# Altium footprint library ICL_connectors_v1.PcbLib: 86 footprints (part 6 of 6)
Each footprint in its own frame and in the unit in brackets; x right, y up, seen from the top. Pads: shape width x height; smd on the part's side, far side on the other; paste and mask are expansions set on the pad; w line width, h text height; cw(c..) or ccw(c..) is an arc to the next point about the centre after c.
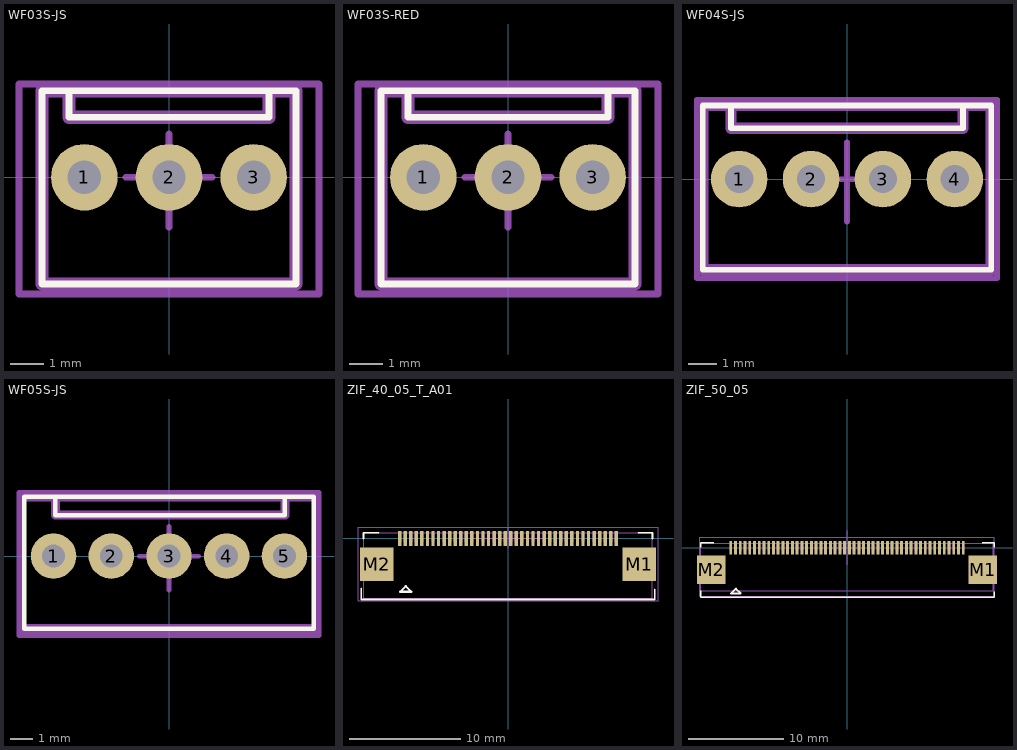
[diagram p5: the footprints below, top view; thin cyan lines are the x and y axes]

## WF03S-JS [mm] "2.54mm  3p WHITE"
pads (3):
  round 2 hole 1: 1(-2.54,0) 2(0,0) 3(2.54,0)
Top Overlay:
  lines w0.2: -3,2.6 -3,1.8 3,1.8 3,2.6 ; -3.81,-3.2 3.81,-3.2 3.81,2.6 -3.81,2.6 -3.81,-3.2
Top M15-16_SORG:
  lines w0.2: -1.3,0 0,0 ; 0,-1.5 0,0 ; 0,1.3 0,0 ; 1.3,0 0,0 ; -4.5,-3.5 -4.5,2.8 4.5,2.8 4.5,-3.5 -4.5,-3.5
Top M17-18_TDES:
  text "'.Designator'" at -5.565,-2.817 h1
Top M19-20_TMOT:
  circle w0.6: c2.54,0 r0.26
  circle w0.6: c0,0 r0.26
  circle w0.6: c-2.54,0 r0.26
  lines w0.4: -3,2.6 -3,1.8 3,1.8 3,2.6 ; -3.81,-3.2 3.81,-3.2 3.81,2.6 -3.81,2.6 -3.81,-3.2
3D body "WF03S_JS.STEP": height 11.51, standoff -3.39, extent -3.81,-3.2 3.81,2.6

## WF03S-RED [mm] "2.54mm  3p RED"
pads (3):
  round 2 hole 1: 1(-2.54,0) 2(0,0) 3(2.54,0)
Top Overlay:
  lines w0.2: -3,2.6 -3,1.8 3,1.8 3,2.6 ; -3.81,-3.2 3.81,-3.2 3.81,2.6 -3.81,2.6 -3.81,-3.2
Top M15-16_SORG:
  lines w0.2: -1.3,0 0,0 ; 0,-1.5 0,0 ; 0,1.3 0,0 ; 1.3,0 0,0 ; -4.5,-3.5 -4.5,2.8 4.5,2.8 4.5,-3.5 -4.5,-3.5
Top M17-18_TDES:
  text "'.Designator'" at -5.865,-2.517 h1
Top M19-20_TMOT:
  circle w0.6: c2.54,0 r0.26
  circle w0.6: c0,0 r0.26
  circle w0.6: c-2.54,0 r0.26
  lines w0.4: -3,2.6 -3,1.8 3,1.8 3,2.6 ; -3.81,-3.2 3.81,-3.2 3.81,2.6 -3.81,2.6 -3.81,-3.2
3D body "WF03S_RED.STEP": height 11.51, standoff -3.39, extent -3.81,-3.2 3.81,2.6

## WF04S-JS [mm] "2.54mm  4p WHITE"
pads (4):
  round 2 hole 1: 1(-3.81,0) 2(-1.27,0) 3(1.27,0) 4(3.81,0)
Top Overlay:
  lines w0.2: -4.1,2.6 -4.1,1.8 4.1,1.8 4.1,2.6 ; -5.1,-3.2 -5.1,2.6 5.1,2.6 5.1,-3.2 -5.1,-3.2
Top M15-16_SORG:
  lines w0.2: -1.3,0 0,0 ; 0,-1.5 0,0 ; 0,1.3 0,0 ; 1.3,0 0,0 ; -5.3,-3.5 5.3,-3.5 5.3,2.8 -5.3,2.8 -5.3,-3.5
Top M17-18_TDES:
  text "'.Designator'" at -5.665,-2.517 h1
Top M19-20_TMOT:
  circle w0.6: c3.81,0 r0.26
  circle w0.6: c1.27,0 r0.26
  circle w0.6: c-1.27,0 r0.26
  circle w0.6: c-3.81,0 r0.26
  lines w0.4: -4.1,2.6 -4.1,1.8 4.1,1.8 4.1,2.6 ; -5.1,-3.2 -5.1,2.6 5.1,2.6 5.1,-3.2 -5.1,-3.2
3D body "61900411121.stp": height 11.51, standoff -3.39, extent -5.08,-3.2 5.08,2.6

## WF05S-JS [mm] "2.54mm  5p WHITE"
pads (5):
  round 2 hole 1: 1(-5.08,0) 2(-2.54,0) 3(0,0) 4(2.54,0) 5(5.08,0)
Top Overlay:
  lines w0.2: -5,2.6 -5,1.8 5.1,1.8 5.1,2.6 ; -6.37,-3.2 6.37,-3.2 6.37,2.6 -6.37,2.6 -6.37,-3.2
Top M15-16_SORG:
  lines w0.2: -1.3,0 0,0 ; 0,-1.5 0,0 ; 0,1.3 0,0 ; 1.3,0 0,0 ; -6.6,-3.5 -6.6,2.8 6.6,2.8 6.6,-3.5 -6.6,-3.5
Top M17-18_TDES:
  text "'.Designator'" at -5.665,-2.517 h1
Top M19-20_TMOT:
  circle w0.6: c-2.54,0 r0.26
  circle w0.6: c0,0 r0.26
  circle w0.6: c2.54,0 r0.26
  circle w0.6: c5.08,0 r0.26
  circle w0.6: c-5.08,0 r0.26
  lines w0.4: -5,2.6 -5,1.8 5.1,1.8 5.1,2.6 ; -6.5,-3.2 -6.5,2.6 6.5,2.6 6.5,-3.2 -6.5,-3.2
3D body "STEP-61900511121-rev1.stp": height 11.51, standoff -3.39, extent -6.35,-3.2 6.35,2.6

## ZIF_40_05_T_A01 [mm] "AMPHENOL_62684-402100ALF"
pads (42):
  rect 0.3x1.35 smd: 1(-9.75,0) 2(-9.25,0) 3(-8.75,0) 4(-8.25,0) 5(-7.75,0) 6(-7.25,0) 7(-6.75,0) 8(-6.25,0) 9(-5.75,0) 10(-5.25,0) 11(-4.75,0) 12(-4.25,0) 13(-3.75,0) 14(-3.25,0) 15(-2.75,0) 16(-2.25,0) 17(-1.75,0) 18(-1.25,0) 19(-0.75,0) 20(-0.25,0) 21(0.25,0) 22(0.75,0) 23(1.25,0) 24(1.75,0) 25(2.25,0) 26(2.75,0) 27(3.25,0) 28(3.75,0) 29(4.25,0) 30(4.75,0) 31(5.25,0) 32(5.75,0) 33(6.25,0) 34(6.75,0) 35(7.25,0) 36(7.75,0) 37(8.25,0) 38(8.75,0) 39(9.25,0) 40(9.75,0)
  rect 3x3 smd: M1(11.8,-2.325) M2(-11.8,-2.325)
Top Overlay:
  lines w0.152: -13.2,-4.5 -13.2,-5.5 13.2,-5.5 13.2,-4.6 ; -13,0 -13,0.5 -11.65,0.5 ; 11.75,0.5 13,0.5 13,0
  lines w0.2: -9.2,-4.3 -8.7,-4.8 -9.7,-4.8 -9.2,-4.3 ; -9.2,-4.3 -9.2,-4.3
Top M11-12_SMOT:
  rectangle: 9.6,-0.3 9.9,0.6
  rectangle: 9.1,-0.3 9.4,0.6
  rectangle: 8.6,-0.3 8.9,0.6
  rectangle: 8.1,-0.3 8.4,0.6
  rectangle: 7.6,-0.3 7.9,0.6
  rectangle: 7.1,-0.3 7.4,0.6
  rectangle: 6.6,-0.3 6.9,0.6
  rectangle: 6.1,-0.3 6.4,0.6
  rectangle: 5.6,-0.3 5.9,0.6
  rectangle: 5.1,-0.3 5.4,0.6
  rectangle: 4.6,-0.3 4.9,0.6
  rectangle: 4.1,-0.3 4.4,0.6
  rectangle: 3.6,-0.3 3.9,0.6
  rectangle: 3.1,-0.3 3.4,0.6
  rectangle: 2.6,-0.3 2.9,0.6
  rectangle: 2.1,-0.3 2.4,0.6
  rectangle: 1.6,-0.3 1.9,0.6
  rectangle: 1.1,-0.3 1.4,0.6
  rectangle: 0.6,-0.3 0.9,0.6
  rectangle: 0.1,-0.3 0.4,0.6
  rectangle: -0.4,-0.3 -0.1,0.6
  rectangle: -0.9,-0.3 -0.6,0.6
  rectangle: -1.4,-0.3 -1.1,0.6
  rectangle: -1.9,-0.3 -1.6,0.6
  rectangle: -2.4,-0.3 -2.1,0.6
  rectangle: -2.9,-0.3 -2.6,0.6
  rectangle: -3.4,-0.3 -3.1,0.6
  rectangle: -3.9,-0.3 -3.6,0.6
  rectangle: -4.4,-0.3 -4.1,0.6
  rectangle: -4.9,-0.3 -4.6,0.6
  rectangle: -5.4,-0.3 -5.1,0.6
  rectangle: -5.9,-0.3 -5.6,0.6
  rectangle: -6.4,-0.3 -6.1,0.6
  rectangle: -6.9,-0.3 -6.6,0.6
  rectangle: -7.4,-0.3 -7.1,0.6
  rectangle: -7.9,-0.3 -7.6,0.6
  rectangle: -8.4,-0.3 -8.1,0.6
  rectangle: -8.9,-0.3 -8.6,0.6
  rectangle: -9.4,-0.3 -9.1,0.6
  rectangle: -9.9,-0.3 -9.6,0.6
  lines w0.1: -13,-5.4 13,-5.4 13,0.5 -13,0.5 -13,-5.4
Top M13-14_SDES:
  text "'.Designator'" at -5.765,-3.417 h1
Top M15-16_SORG:
  lines w0.1: -3.4,0 0,0 ; 0,-0.9 0,0 ; 0,0.9 0,0 ; 3.4,0 0,0 ; -13.5,-5.6 13.5,-5.6 13.5,1 -13.5,1 -13.5,0 -13.5,-5.6
3D body "s62684-402100alf.STEP": height 2.06, standoff 0.01, extent -12.75,-5.3 12.75,0.3

## ZIF_50_05 [mm] "Top contact 50 pin 0,5mm zif connector"
pads (52):
  rect 0.3x1.4 smd: 1(-12.25,0) 2(-11.75,0) 3(-11.25,0) 4(-10.75,0) 5(-10.25,0) 6(-9.75,0) 7(-9.25,0) 8(-8.75,0) 9(-8.25,0) 10(-7.75,0) 11(-7.25,0) 12(-6.75,0) 13(-6.25,0) 14(-5.75,0) 15(-5.25,0) 16(-4.75,0) 17(-4.25,0) 18(-3.75,0) 19(-3.25,0) 20(-2.75,0) 21(-2.25,0) 22(-1.75,0) 23(-1.25,0) 24(-0.75,0) 25(-0.25,0) 26(0.25,0) 27(0.75,0) 28(1.25,0) 29(1.75,0) 30(2.25,0) 31(2.75,0) 32(3.25,0) 33(3.75,0) 34(4.25,0) 35(4.75,0) 36(5.25,0) 37(5.75,0) 38(6.25,0) 39(6.75,0) 40(7.25,0) 41(7.75,0) 42(8.25,0) 43(8.75,0) 44(9.25,0) 45(9.75,0) 46(10.25,0) 47(10.75,0) 48(11.25,0) 49(11.75,0) 50(12.25,0)
  rect 3x3 smd: M1(14.3,-2.325) M2(-14.3,-2.325)
Top Overlay:
  lines w0.152: -15.43,-4.5 -15.43,-5.2 15.5,-5.2 15.5,-4.6 ; -15.4,0.05 -15.4,0.55 -14.05,0.55 ; 14.25,0.55 15.5,0.55 15.5,0.05
  lines w0.2: -11.7,-4.3 -11.2,-4.8 -12.2,-4.8 -11.7,-4.3 ; -11.7,-4.3 -11.7,-4.3
Top M11-12_SMOT:
  rectangle: -12.4,-0.3 -12.1,0.6
  rectangle: -11.9,-0.3 -11.6,0.6
  rectangle: -11.4,-0.3 -11.1,0.6
  rectangle: -10.9,-0.3 -10.6,0.6
  rectangle: -10.4,-0.3 -10.1,0.6
  rectangle: -9.9,-0.3 -9.6,0.6
  rectangle: -9.4,-0.3 -9.1,0.6
  rectangle: -8.9,-0.3 -8.6,0.6
  rectangle: -8.4,-0.3 -8.1,0.6
  rectangle: -7.9,-0.3 -7.6,0.6
  rectangle: -7.4,-0.3 -7.1,0.6
  rectangle: -6.9,-0.3 -6.6,0.6
  rectangle: -6.4,-0.3 -6.1,0.6
  rectangle: -5.9,-0.3 -5.6,0.6
  rectangle: -5.4,-0.3 -5.1,0.6
  rectangle: -4.9,-0.3 -4.6,0.6
  rectangle: -4.4,-0.3 -4.1,0.6
  rectangle: -3.9,-0.3 -3.6,0.6
  rectangle: -3.4,-0.3 -3.1,0.6
  rectangle: -2.9,-0.3 -2.6,0.6
  rectangle: -2.4,-0.3 -2.1,0.6
  rectangle: -1.9,-0.3 -1.6,0.6
  rectangle: -1.4,-0.3 -1.1,0.6
  rectangle: -0.9,-0.3 -0.6,0.6
  rectangle: -0.4,-0.3 -0.1,0.6
  rectangle: 0.1,-0.3 0.4,0.6
  rectangle: 0.6,-0.3 0.9,0.6
  rectangle: 1.1,-0.3 1.4,0.6
  rectangle: 1.6,-0.3 1.9,0.6
  rectangle: 2.1,-0.3 2.4,0.6
  rectangle: 2.6,-0.3 2.9,0.6
  rectangle: 3.1,-0.3 3.4,0.6
  rectangle: 3.6,-0.3 3.9,0.6
  rectangle: 4.1,-0.3 4.4,0.6
  rectangle: 4.6,-0.3 4.9,0.6
  rectangle: 5.1,-0.3 5.4,0.6
  rectangle: 5.6,-0.3 5.9,0.6
  rectangle: 6.1,-0.3 6.4,0.6
  rectangle: 6.6,-0.3 6.9,0.6
  rectangle: 7.1,-0.3 7.4,0.6
  rectangle: 7.6,-0.3 7.9,0.6
  rectangle: 8.1,-0.3 8.4,0.6
  rectangle: 8.6,-0.3 8.9,0.6
  rectangle: 9.1,-0.3 9.4,0.6
  rectangle: 9.6,-0.3 9.9,0.6
  rectangle: 10.1,-0.3 10.4,0.6
  rectangle: 10.6,-0.3 10.9,0.6
  rectangle: 11.1,-0.3 11.4,0.6
  rectangle: 11.6,-0.3 11.9,0.6
  rectangle: 12.1,-0.3 12.4,0.6
  lines w0.1: -15.425,-4.5 -15.425,0.5 15.425,0.5 15.425,-4.5 -15.425,-4.5
Top M13-14_SDES:
  text "'.Designator'" at -5.765,-3.417 h1
Top M15-16_SORG:
  lines w0.1: -1.8,0 0,0 ; 0,-1.8 0,0 ; 0,1.8 0,0 ; 1.8,0 0,0 ; -15.5,-5.1 -15.5,1.1 15.5,1.1 15.5,-5.1 -15.5,-5.1
3D body "affc20-50-050-sht-t.stp": height 2.03, standoff -0.01, extent -15.25,-4.9 15.25,0.5